# Altium schematic symbol library Regulator_Switching.SchLib: 1120 symbols (part 8 of 8)
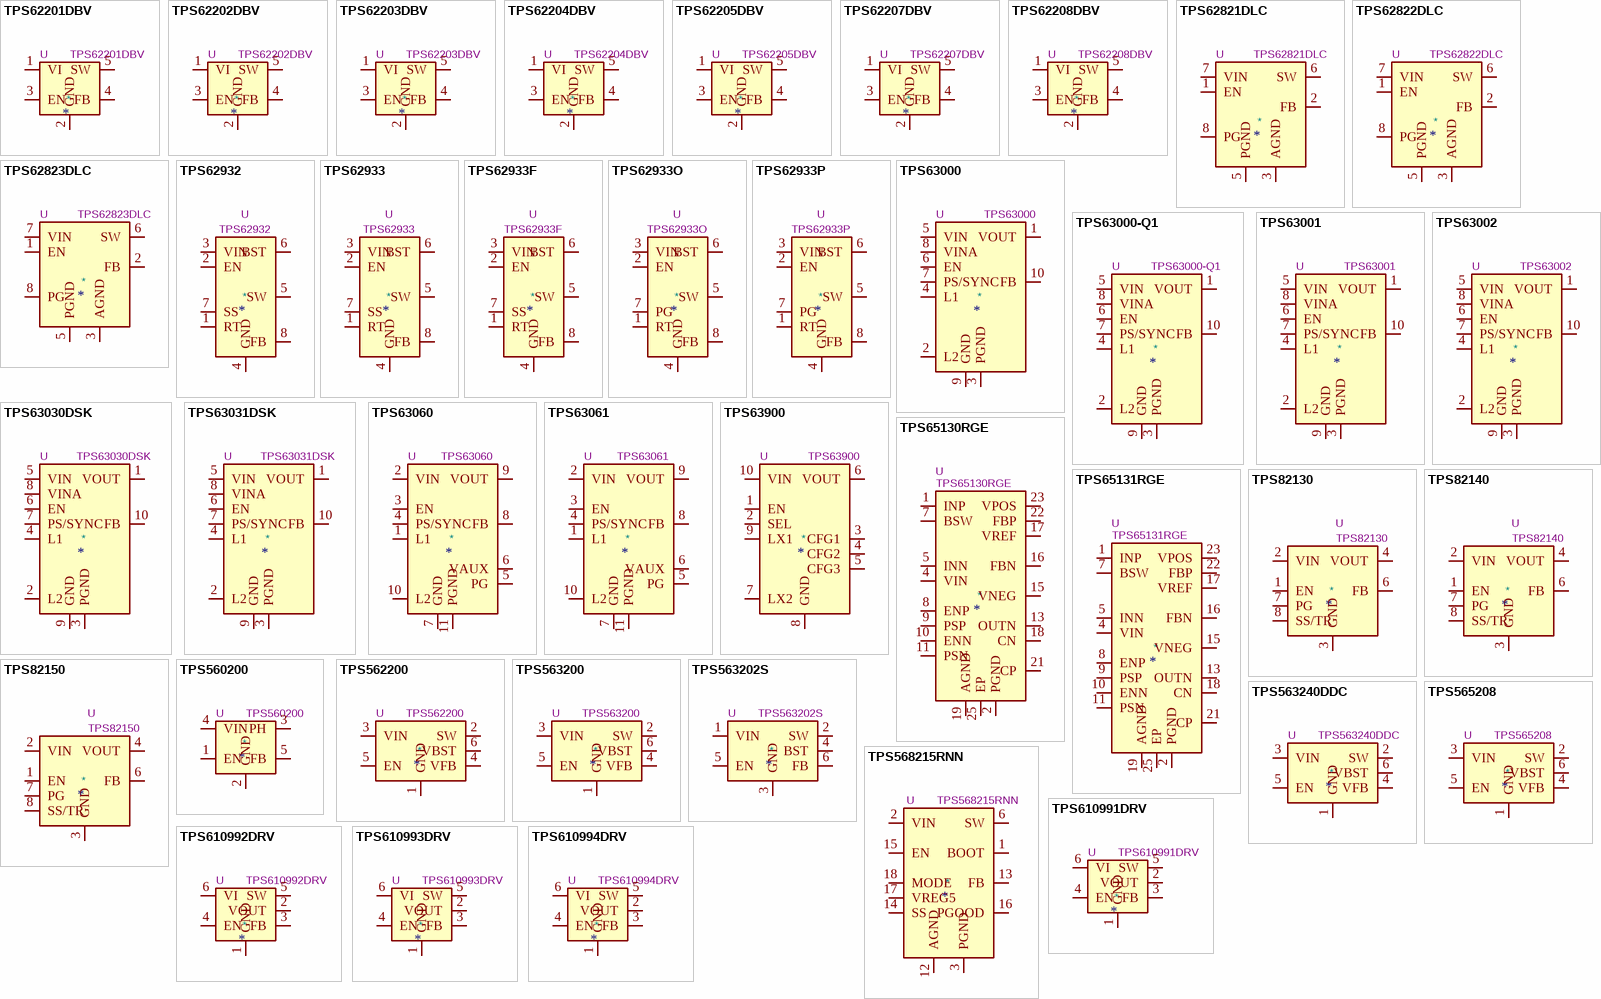
[diagram p34: symbols TPS62201DBV to TPS610994DRV]

## TPS568215RNN
designator *  value TPS568215RNN  Reference: U
ki_keywords: switching buck converter step-down; ki_description: 4.5V-17V Input, 8A Synchronous Step-Down SWIFT Converter, Adjustable Output, 400kHz/800kHz/1.2MHz Switching Frequency, Texas VQFN-18; ki_fp_filters: Texas*RNN0018A*; Footprint: Package_DFN_QFN:Texas_RNN0018A; Datasheet: http://www.ti.com/lit/ds/symlink/tps568215.pdf
pins: 1 BOOT, 2 VIN, 3 PGND, 4 PGND hidden, 5 PGND hidden, 6 SW, 7 SW hidden, 8 PGND hidden, 9 PGND hidden, 10 PGND hidden, 11 VIN hidden, 12 AGND, 13 FB, 14 SS, 15 EN, 16 PGOOD, 17 VREG5, 18 MODE

## TPS610991DRV
designator *  value TPS610991DRV  Reference: U
ki_keywords: Step-Up DC-DC Converter; ki_description: Boost Converter, 0.7-5.5V Input Voltage, 1A Switch Current, Fixed 1.8V Output Voltage, WSON-6; ki_fp_filters: WSON*1EP*2x2mm*P0.65mm*; Footprint: Package_SON:WSON-6-1EP_2x2mm_P0.65mm_EP1x1.6mm; Datasheet: https://www.ti.com/lit/gpn/TPS61099
pins: 1 GND, 2 VOUT, 3 FB, 4 EN, 5 SW, 6 VI, 7 GND hidden

## TPS610992DRV
designator *  value TPS610992DRV  Reference: U
ki_keywords: Step-Up DC-DC Converter; ki_description: Boost Converter, 0.7-5.5V Input Voltage, 1A Switch Current, Fixed 2.5V Output Voltage, WSON-6; ki_fp_filters: WSON*1EP*2x2mm*P0.65mm*; Footprint: Package_SON:WSON-6-1EP_2x2mm_P0.65mm_EP1x1.6mm; Datasheet: https://www.ti.com/lit/gpn/TPS61099
pins: 1 GND, 2 VOUT, 3 FB, 4 EN, 5 SW, 6 VI, 7 GND hidden

## TPS610993DRV
designator *  value TPS610993DRV  Reference: U
ki_keywords: Step-Up DC-DC Converter; ki_description: Boost Converter, 0.7-5.5V Input Voltage, 1A Switch Current, Fixed 3V Output Voltage, WSON-6; ki_fp_filters: WSON*1EP*2x2mm*P0.65mm*; Footprint: Package_SON:WSON-6-1EP_2x2mm_P0.65mm_EP1x1.6mm; Datasheet: https://www.ti.com/lit/gpn/TPS61099
pins: 1 GND, 2 VOUT, 3 FB, 4 EN, 5 SW, 6 VI, 7 GND hidden

## TPS610994DRV
designator *  value TPS610994DRV  Reference: U
ki_keywords: Step-Up DC-DC Converter; ki_description: Boost Converter, 0.7-5.5V Input Voltage, 1A Switch Current, Fixed 3.3V Output Voltage, WSON-6; ki_fp_filters: WSON*1EP*2x2mm*P0.65mm*; Footprint: Package_SON:WSON-6-1EP_2x2mm_P0.65mm_EP1x1.6mm; Datasheet: https://www.ti.com/lit/gpn/TPS61099
pins: 1 GND, 2 VOUT, 3 FB, 4 EN, 5 SW, 6 VI, 7 GND hidden

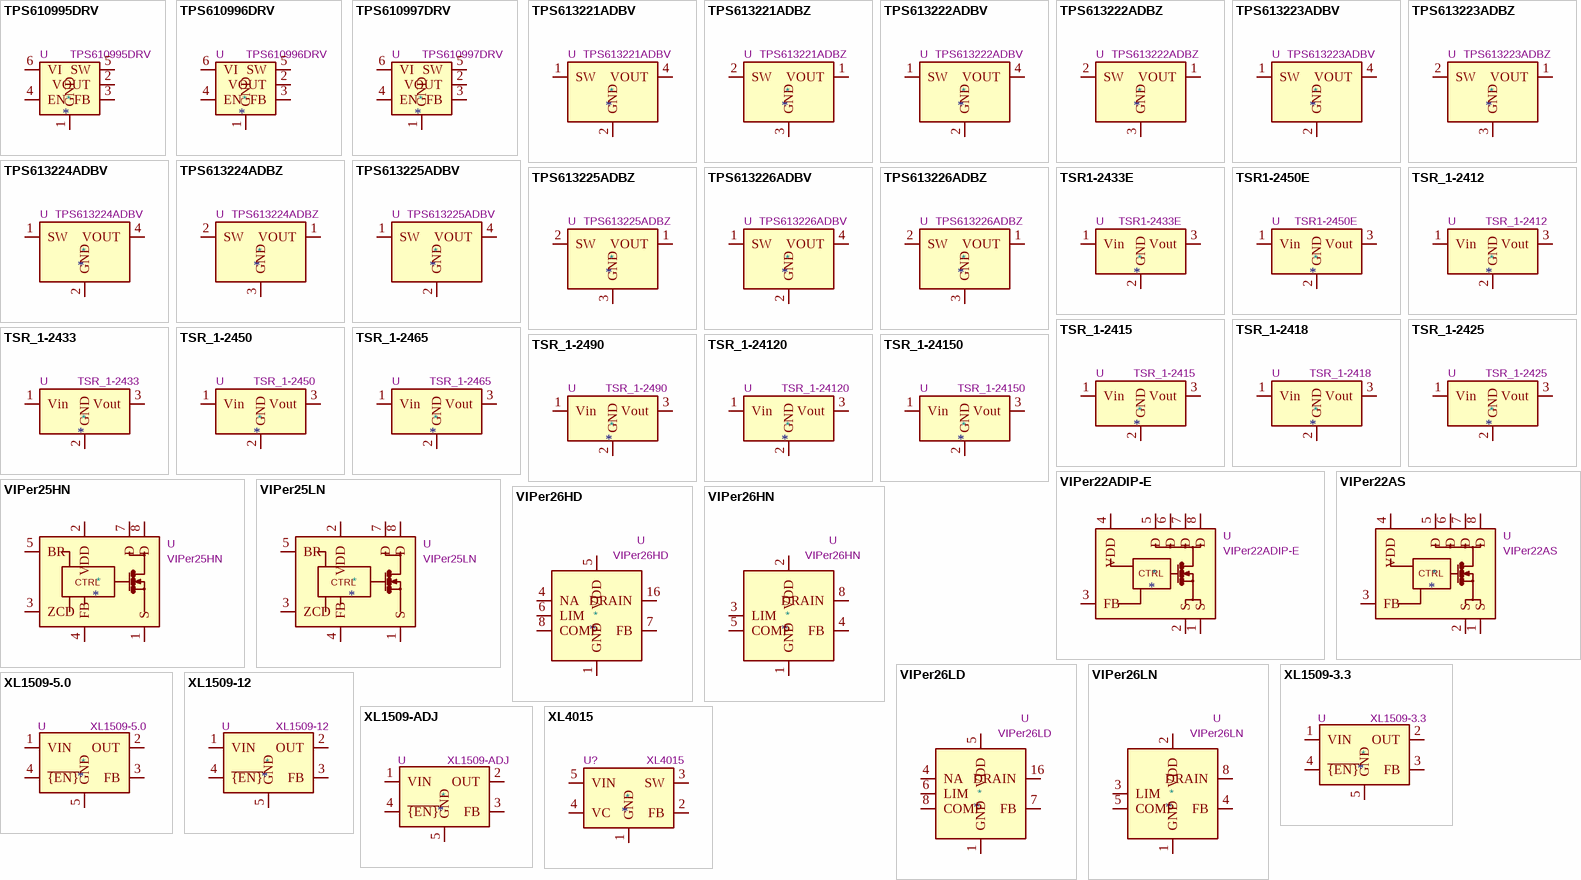
[diagram p27: symbols TPS610995DRV to XL4015]

## TPS610995DRV
designator *  value TPS610995DRV  Reference: U
ki_keywords: Step-Up DC-DC Converter; ki_description: Boost Converter, 0.7-5.5V Input Voltage, 1A Switch Current, Fixed 3.6V Output Voltage, WSON-6; ki_fp_filters: WSON*1EP*2x2mm*P0.65mm*; Footprint: Package_SON:WSON-6-1EP_2x2mm_P0.65mm_EP1x1.6mm; Datasheet: https://www.ti.com/lit/gpn/TPS61099
pins: 1 GND, 2 VOUT, 3 FB, 4 EN, 5 SW, 6 VI, 7 GND hidden

## TPS610996DRV
designator *  value TPS610996DRV  Reference: U
ki_keywords: Step-Up DC-DC Converter; ki_description: Boost Converter, 0.7-5.5V Input Voltage, 1A Switch Current, Fixed 4.5V Output Voltage, WSON-6; ki_fp_filters: WSON*1EP*2x2mm*P0.65mm*; Footprint: Package_SON:WSON-6-1EP_2x2mm_P0.65mm_EP1x1.6mm; Datasheet: https://www.ti.com/lit/gpn/TPS61099
pins: 1 GND, 2 VOUT, 3 FB, 4 EN, 5 SW, 6 VI, 7 GND hidden

## TPS610997DRV
designator *  value TPS610997DRV  Reference: U
ki_keywords: Step-Up DC-DC Converter; ki_description: Boost Converter, 0.7-5.5V Input Voltage, 1A Switch Current, 5V Fixed Output Voltage, WSON-6; ki_fp_filters: WSON*1EP*2x2mm*P0.65mm*; Footprint: Package_SON:WSON-6-1EP_2x2mm_P0.65mm_EP1x1.6mm; Datasheet: https://www.ti.com/lit/gpn/TPS61099
pins: 1 GND, 2 VOUT, 3 FB, 4 EN, 5 SW, 6 VI, 7 GND hidden

## TPS613221ADBV
designator *  value TPS613221ADBV  Reference: U
ki_keywords: Boost converter; ki_description: 1.2A Step-Up Converter, 3.3V Output Voltage, 0.9-5.5V Input Voltage, SOT-23-5; ki_fp_filters: SOT?23*; Footprint: Package_TO_SOT_SMD:SOT-23-5; Datasheet: http://www.ti.com/lit/ds/symlink/tps61322.pdf
pins: 1 SW, 2 GND, 3 NC hidden, 4 VOUT, 5 NC hidden

## TPS613221ADBZ
designator *  value TPS613221ADBZ  Reference: U
ki_keywords: Boost converter; ki_description: 1.2A Step-Up Converter, 3.3V Output Voltage, 0.9-5.5V Input Voltage, SOT-23; ki_fp_filters: SOT?23*; Footprint: Package_TO_SOT_SMD:SOT-23; Datasheet: http://www.ti.com/lit/ds/symlink/tps61322.pdf
pins: 1 VOUT, 2 SW, 3 GND

## TPS613222ADBV
designator *  value TPS613222ADBV  Reference: U
ki_keywords: Boost converter; ki_description: 1.8A Step-Up Converter, 5V Output Voltage, 0.9-5.5V Input Voltage, SOT-23-5; ki_fp_filters: SOT?23*; Footprint: Package_TO_SOT_SMD:SOT-23-5; Datasheet: http://www.ti.com/lit/ds/symlink/tps61322.pdf
pins: 1 SW, 2 GND, 3 NC hidden, 4 VOUT, 5 NC hidden

## TPS613222ADBZ
designator *  value TPS613222ADBZ  Reference: U
ki_keywords: Boost converter; ki_description: 1.8A Step-Up Converter, 5V Output Voltage, 0.9-5.5V Input Voltage, SOT-23; ki_fp_filters: SOT?23*; Footprint: Package_TO_SOT_SMD:SOT-23; Datasheet: http://www.ti.com/lit/ds/symlink/tps61322.pdf
pins: 1 VOUT, 2 SW, 3 GND

## TPS613223ADBV
designator *  value TPS613223ADBV  Reference: U
ki_keywords: Boost converter; ki_description: 750mA Step-Up Converter, 2V Output Voltage, 0.9-5.5V Input Voltage, SOT-23-5; ki_fp_filters: SOT?23*; Footprint: Package_TO_SOT_SMD:SOT-23-5; Datasheet: http://www.ti.com/lit/ds/symlink/tps61322.pdf
pins: 1 SW, 2 GND, 3 NC hidden, 4 VOUT, 5 NC hidden

## TPS613223ADBZ
designator *  value TPS613223ADBZ  Reference: U
ki_keywords: Boost converter; ki_description: 750mA Step-Up Converter, 2V Output Voltage, 0.9-5.5V Input Voltage, SOT-23; ki_fp_filters: SOT?23*; Footprint: Package_TO_SOT_SMD:SOT-23; Datasheet: http://www.ti.com/lit/ds/symlink/tps61322.pdf
pins: 1 VOUT, 2 SW, 3 GND

## TPS613224ADBV
designator *  value TPS613224ADBV  Reference: U
ki_keywords: Boost converter; ki_description: 750mA Step-Up Converter, 2.5V Output Voltage, 0.9-5.5V Input Voltage, SOT-23-5; ki_fp_filters: SOT?23*; Footprint: Package_TO_SOT_SMD:SOT-23-5; Datasheet: http://www.ti.com/lit/ds/symlink/tps61322.pdf
pins: 1 SW, 2 GND, 3 NC hidden, 4 VOUT, 5 NC hidden

## TPS613224ADBZ
designator *  value TPS613224ADBZ  Reference: U
ki_keywords: Boost converter; ki_description: 750mA Step-Up Converter, 2.5V Output Voltage, 0.9-5.5V Input Voltage, SOT-23; ki_fp_filters: SOT?23*; Footprint: Package_TO_SOT_SMD:SOT-23; Datasheet: http://www.ti.com/lit/ds/symlink/tps61322.pdf
pins: 1 VOUT, 2 SW, 3 GND

## TPS613225ADBV
designator *  value TPS613225ADBV  Reference: U
ki_keywords: Boost converter; ki_description: 1.2A Step-Up Converter, 3V Output Voltage, 0.9-5.5V Input Voltage, SOT-23-5; ki_fp_filters: SOT?23*; Footprint: Package_TO_SOT_SMD:SOT-23-5; Datasheet: http://www.ti.com/lit/ds/symlink/tps61322.pdf
pins: 1 SW, 2 GND, 3 NC hidden, 4 VOUT, 5 NC hidden

## TPS613225ADBZ
designator *  value TPS613225ADBZ  Reference: U
ki_keywords: Boost converter; ki_description: 1.2A Step-Up Converter, 3V Output Voltage, 0.9-5.5V Input Voltage, SOT-23; ki_fp_filters: SOT?23*; Footprint: Package_TO_SOT_SMD:SOT-23; Datasheet: http://www.ti.com/lit/ds/symlink/tps61322.pdf
pins: 1 VOUT, 2 SW, 3 GND

## TPS613226ADBV
designator *  value TPS613226ADBV  Reference: U
ki_keywords: Boost converter; ki_description: 1.2A Step-Up Converter, 3.6V Output Voltage, 0.9-5.5V Input Voltage, SOT-23-5; ki_fp_filters: SOT?23*; Footprint: Package_TO_SOT_SMD:SOT-23-5; Datasheet: http://www.ti.com/lit/ds/symlink/tps61322.pdf
pins: 1 SW, 2 GND, 3 NC hidden, 4 VOUT, 5 NC hidden

## TPS613226ADBZ
designator *  value TPS613226ADBZ  Reference: U
ki_keywords: Boost converter; ki_description: 1.2A Step-Up Converter, 3.6V Output Voltage, 0.9-5.5V Input Voltage, SOT-23; ki_fp_filters: SOT?23*; Footprint: Package_TO_SOT_SMD:SOT-23; Datasheet: http://www.ti.com/lit/ds/symlink/tps61322.pdf
pins: 1 VOUT, 2 SW, 3 GND

## TSR1-2433E
designator *  value TSR1-2433E  Reference: U
ki_keywords: Traco non-isolated not-isolated pol dc-dc converter regulator single 1A; ki_description: 1A step-down regulator, fixed 3.3V output voltage, 6-36V input voltage, TO-220 compatible LM78xx replacement; ki_fp_filters: Converter*DCDC*TRACO*TSR1*xxxxE*THT*; Footprint: Converter_DCDC:Converter_DCDC_TRACO_TSR1-xxxxE_THT; Datasheet: https://www.tracopower.com/products/tsr1e.pdf
pins: 1 Vin, 2 GND, 3 Vout

## TSR1-2450E
designator *  value TSR1-2450E  Reference: U
ki_keywords: Traco non-isolated not-isolated pol dc-dc converter regulator single 1A; ki_description: 1A step-down regulator, fixed 5V output voltage, 7-36V input voltage, TO-220 compatible LM78xx replacement; ki_fp_filters: Converter*DCDC*TRACO*TSR1*xxxxE*THT*; Footprint: Converter_DCDC:Converter_DCDC_TRACO_TSR1-xxxxE_THT; Datasheet: https://www.tracopower.com/products/tsr1e.pdf
pins: 1 Vin, 2 GND, 3 Vout

## TSR_1-2412
designator *  value TSR_1-2412  Reference: U
ki_keywords: dc-dc traco buck; ki_description: 1A step-down regulator module, fixed 1.2V output voltage, 6-36V input voltage, -40°C to +85°C temperature range, TO-220 compatible LM78xx replacement; ki_fp_filters: Converter*DCDC*TRACO*TSR?1*; Footprint: Converter_DCDC:Converter_DCDC_TRACO_TSR-1_THT; Datasheet: http://www.tracopower.com/products/tsr1.pdf
pins: 1 Vin, 2 GND, 3 Vout

## TSR_1-2415
designator *  value TSR_1-2415  Reference: U
ki_keywords: dc-dc traco buck; ki_description: 1A step-down regulator module, fixed 1.5V output voltage, 6-36V input voltage, -40°C to +85°C temperature range, TO-220 compatible LM78xx replacement; ki_fp_filters: Converter*DCDC*TRACO*TSR?1*; Footprint: Converter_DCDC:Converter_DCDC_TRACO_TSR-1_THT; Datasheet: http://www.tracopower.com/products/tsr1.pdf
pins: 1 Vin, 2 GND, 3 Vout

## TSR_1-2418
designator *  value TSR_1-2418  Reference: U
ki_keywords: dc-dc traco buck; ki_description: 1A step-down regulator module, fixed 1.8V output voltage, 6-36V input voltage, -40°C to +85°C temperature range, TO-220 compatible LM78xx replacement; ki_fp_filters: Converter*DCDC*TRACO*TSR?1*; Footprint: Converter_DCDC:Converter_DCDC_TRACO_TSR-1_THT; Datasheet: http://www.tracopower.com/products/tsr1.pdf
pins: 1 Vin, 2 GND, 3 Vout

## TSR_1-2425
designator *  value TSR_1-2425  Reference: U
ki_keywords: dc-dc traco buck; ki_description: 1A step-down regulator module, fixed 2.5V output voltage, 6-36V input voltage, -40°C to +85°C temperature range, TO-220 compatible LM78xx replacement; ki_fp_filters: Converter*DCDC*TRACO*TSR?1*; Footprint: Converter_DCDC:Converter_DCDC_TRACO_TSR-1_THT; Datasheet: http://www.tracopower.com/products/tsr1.pdf
pins: 1 Vin, 2 GND, 3 Vout

## TSR_1-2433
designator *  value TSR_1-2433  Reference: U
ki_keywords: dc-dc traco buck; ki_description: 1A step-down regulator module, fixed 3.3V output voltage, 5-36V input voltage, -40°C to +85°C temperature range, TO-220 compatible LM78xx replacement; ki_fp_filters: Converter*DCDC*TRACO*TSR?1*; Footprint: Converter_DCDC:Converter_DCDC_TRACO_TSR-1_THT; Datasheet: http://www.tracopower.com/products/tsr1.pdf
pins: 1 Vin, 2 GND, 3 Vout

## TSR_1-2450
designator *  value TSR_1-2450  Reference: U
ki_keywords: dc-dc traco buck; ki_description: 1A step-down regulator module, fixed 5V output voltage, 5-36V input voltage, -40°C to +85°C temperature range, TO-220 compatible LM78xx replacement; ki_fp_filters: Converter*DCDC*TRACO*TSR?1*; Footprint: Converter_DCDC:Converter_DCDC_TRACO_TSR-1_THT; Datasheet: http://www.tracopower.com/products/tsr1.pdf
pins: 1 Vin, 2 GND, 3 Vout

## TSR_1-2465
designator *  value TSR_1-2465  Reference: U
ki_keywords: dc-dc traco buck; ki_description: 1A step-down regulator module, fixed 6.5V output voltage, 9-36V input voltage, -40°C to +85°C temperature range, TO-220 compatible LM78xx replacement; ki_fp_filters: Converter*DCDC*TRACO*TSR?1*; Footprint: Converter_DCDC:Converter_DCDC_TRACO_TSR-1_THT; Datasheet: http://www.tracopower.com/products/tsr1.pdf
pins: 1 Vin, 2 GND, 3 Vout

## TSR_1-2490
designator *  value TSR_1-2490  Reference: U
ki_keywords: dc-dc traco buck; ki_description: 1A step-down regulator module, fixed 9V output voltage, 2-36V input voltage, -40°C to +85°C temperature range, TO-220 compatible LM78xx replacement; ki_fp_filters: Converter*DCDC*TRACO*TSR?1*; Footprint: Converter_DCDC:Converter_DCDC_TRACO_TSR-1_THT; Datasheet: http://www.tracopower.com/products/tsr1.pdf
pins: 1 Vin, 2 GND, 3 Vout

## TSR_1-24120
designator *  value TSR_1-24120  Reference: U
ki_keywords: dc-dc traco buck; ki_description: 1A step-down regulator module, fixed 12V output voltage, 5-36V input voltage, -40°C to +85°C temperature range, TO-220 compatible LM78xx replacement; ki_fp_filters: Converter*DCDC*TRACO*TSR?1*; Footprint: Converter_DCDC:Converter_DCDC_TRACO_TSR-1_THT; Datasheet: http://www.tracopower.com/products/tsr1.pdf
pins: 1 Vin, 2 GND, 3 Vout

## TSR_1-24150
designator *  value TSR_1-24150  Reference: U
ki_keywords: dc-dc traco buck; ki_description: 1A step-down regulator module, fixed 15V output voltage, 8-36V input voltage, -40°C to +85°C temperature range, TO-220 compatible LM78xx replacement; ki_fp_filters: Converter*DCDC*TRACO*TSR?1*; Footprint: Converter_DCDC:Converter_DCDC_TRACO_TSR-1_THT; Datasheet: http://www.tracopower.com/products/tsr1.pdf
pins: 1 Vin, 2 GND, 3 Vout

## VIPer22ADIP-E
designator *  value VIPer22ADIP-E  Reference: U
ki_keywords: SMPS; ki_description: Low power OFF-line SMPS primary switcher; ki_fp_filters: DIP*W7.62mm*; Footprint: Package_DIP:DIP-8_W7.62mm; Datasheet: http://www.st.com/web/en/resource/technical/document/datasheet/CD00087939.pdf
pins: 1 S, 2 S, 3 FB, 4 VDD, 5 D, 6 D, 7 D, 8 D
text: CTRL

## VIPer22AS
designator *  value VIPer22AS  Reference: U
ki_keywords: SMPS; ki_description: Low power OFF-line SMPS primary switcher; ki_fp_filters: SOIC*3.9x4.9mm*P1.27mm*; Footprint: Package_SO:SOIC-8_3.9x4.9mm_P1.27mm; Datasheet: http://www.st.com/web/en/resource/technical/document/datasheet/CD00087939.pdf
pins: 1 S, 2 S, 3 FB, 4 VDD, 5 D, 6 D, 7 D, 8 D
text: CTRL

## VIPer25HN
designator *  value VIPer25HN  Reference: U
ki_keywords: SMPS Controller with MOSFET 12W AC-DC; ki_description: 12W SMPS Controller, AC-DC, PDIP-7; ki_fp_filters: *PDIP*8B*; Footprint: Package_DIP:PowerIntegrations_PDIP-8B; Datasheet: http://www.st.com/internet/com/TECHNICAL_RESOURCES/TECHNICAL_LITERATURE/DATASHEET/CD00231127.pdf
pins: 1 S, 2 VDD, 3 ZCD, 4 FB, 5 BR, 7 D, 8 D
text: CTRL

## VIPer25LN
designator *  value VIPer25LN  Reference: U
ki_keywords: SMPS Controller with MOSFET 12W AC-DC; ki_description: 12W SMPS Controller, AC-DC, PDIP-7; ki_fp_filters: *PDIP*8B*; Footprint: Package_DIP:PowerIntegrations_PDIP-8B; Datasheet: http://www.st.com/internet/com/TECHNICAL_RESOURCES/TECHNICAL_LITERATURE/DATASHEET/CD00231127.pdf
pins: 1 S, 2 VDD, 3 ZCD, 4 FB, 5 BR, 7 D, 8 D
text: CTRL

## VIPer26HD
designator *  value VIPer26HD  Reference: U
ki_keywords: SMPS Controller with MOSFET; ki_description: 800V, 10-20W, 115kHz, SMPS Controller, SOIC-16; ki_fp_filters: SOIC*3.9x9.9mm*P1.27mm*; Footprint: Package_SO:SOIC-16_3.9x9.9mm_P1.27mm; Datasheet: https://www.st.com/resource/en/datasheet/viper26.pdf
pins: 1 GND, 2 GND hidden, 3 NC hidden, 4 NA, 5 VDD, 6 LIM, 7 FB, 8 COMP, 9 NC hidden, 10 NC hidden, 11 NC hidden, 12 NC hidden, 13 DRAIN hidden, 14 DRAIN hidden, 15 DRAIN hidden, 16 DRAIN

## VIPer26HN
designator *  value VIPer26HN  Reference: U
ki_keywords: SMPS Controller with MOSFET; ki_description: 800V, 10-20W, 115kHz, SMPS Controller, DIP-7; ki_fp_filters: DIP*N6*W7.62mm*; Footprint: Package_DIP:DIP-8-N6_W7.62mm; Datasheet: https://www.st.com/resource/en/datasheet/viper26.pdf
pins: 1 GND, 2 VDD, 3 LIM, 4 FB, 5 COMP, 7 DRAIN hidden, 8 DRAIN

## VIPer26LD
designator *  value VIPer26LD  Reference: U
ki_keywords: SMPS Controller with MOSFET; ki_description: 800V, 10-20W, 60kHz, SMPS Controller, SOIC-16; ki_fp_filters: SOIC*3.9x9.9mm*P1.27mm*; Footprint: Package_SO:SOIC-16_3.9x9.9mm_P1.27mm; Datasheet: https://www.st.com/resource/en/datasheet/viper26.pdf
pins: 1 GND, 2 GND hidden, 3 NC hidden, 4 NA, 5 VDD, 6 LIM, 7 FB, 8 COMP, 9 NC hidden, 10 NC hidden, 11 NC hidden, 12 NC hidden, 13 DRAIN hidden, 14 DRAIN hidden, 15 DRAIN hidden, 16 DRAIN

## VIPer26LN
designator *  value VIPer26LN  Reference: U
ki_keywords: SMPS Controller with MOSFET; ki_description: 800V, 10-20W, 60kHz, SMPS Controller, DIP-7; ki_fp_filters: DIP*N6*W7.62mm*; Footprint: Package_DIP:DIP-8-N6_W7.62mm; Datasheet: https://www.st.com/resource/en/datasheet/viper26.pdf
pins: 1 GND, 2 VDD, 3 LIM, 4 FB, 5 COMP, 7 DRAIN hidden, 8 DRAIN

## XL1509-3.3
designator *  value XL1509-3.3  Reference: U
ki_keywords: Buck DC/DC converter; ki_description: Buck DC/DC Converter, 2A, 3.3V Output Voltage, 4.5-40V Input Voltage; ki_fp_filters: SOIC*3.9x4.9mm*P1.27mm*; Footprint: Package_SO:SOIC-8_3.9x4.9mm_P1.27mm; Datasheet: https://datasheet.lcsc.com/lcsc/1809050422_XLSEMI-XL1509-5-0E1_C61063.pdf
pins: 1 VIN, 2 OUT, 3 FB, 4 ~{{EN}}, 5 GND, 6 GND hidden, 7 GND hidden, 8 GND hidden

## XL1509-5.0
designator *  value XL1509-5.0  Reference: U
ki_keywords: Buck DC/DC Converter; ki_description: Buck DC/DC Converter, 2A, 5V Output Voltage, 7-40V Input Voltage; ki_fp_filters: SOIC*3.9x4.9mm*P1.27mm*; Footprint: Package_SO:SOIC-8_3.9x4.9mm_P1.27mm; Datasheet: https://datasheet.lcsc.com/lcsc/1809050422_XLSEMI-XL1509-5-0E1_C61063.pdf
pins: 1 VIN, 2 OUT, 3 FB, 4 ~{{EN}}, 5 GND, 6 GND hidden, 7 GND hidden, 8 GND hidden

## XL1509-12
designator *  value XL1509-12  Reference: U
ki_keywords: Buck DC/DC Converter; ki_description: Buck DC/DC Converter, 2A, 12V Output Voltage, 15-40V Input Voltage; ki_fp_filters: SOIC*3.9x4.9mm*P1.27mm*; Footprint: Package_SO:SOIC-8_3.9x4.9mm_P1.27mm; Datasheet: https://datasheet.lcsc.com/lcsc/1809050422_XLSEMI-XL1509-5-0E1_C61063.pdf
pins: 1 VIN, 2 OUT, 3 FB, 4 ~{{EN}}, 5 GND, 6 GND hidden, 7 GND hidden, 8 GND hidden

## XL1509-ADJ
designator *  value XL1509-ADJ  Reference: U
ki_keywords: Buck DC/DC Converter; ki_description: Buck DC/DC Converter, 2A, 1.23-37V Adjustable Output Voltage, 4.5-40V Input Voltage; ki_fp_filters: SOIC*3.9x4.9mm*P1.27mm*; Footprint: Package_SO:SOIC-8_3.9x4.9mm_P1.27mm; Datasheet: https://datasheet.lcsc.com/lcsc/1809050422_XLSEMI-XL1509-5-0E1_C61063.pdf
pins: 1 VIN, 2 OUT, 3 FB, 4 ~{{EN}}, 5 GND, 6 GND hidden, 7 GND hidden, 8 GND hidden

## XL4015
designator *  value XL4015  Reference: U?
ki_keywords: Buck DC-DC; ki_description: 5A 180kHz 36V Buck DC to DC Converter; ki_fp_filters: TO?263*; Footprint: Package_TO_SOT_SMD:TO-263-5_TabPin3; Datasheet: http://www.xlsemi.net/datasheet/XL4015%20datasheet-English.pdf
pins: 1 GND, 2 FB, 3 SW, 4 VC, 5 VIN